# Altium footprint library 6-Connectors-6.PcbLib: 117 footprints (part 6 of 8)
Each footprint in its own frame and in the unit in brackets; x right, y up, seen from the top. Pads: shape width x height; smd on the part's side, far side on the other; paste and mask are expansions set on the pad; w line width, h text height; cw(c..) or ccw(c..) is an arc to the next point about the centre after c.
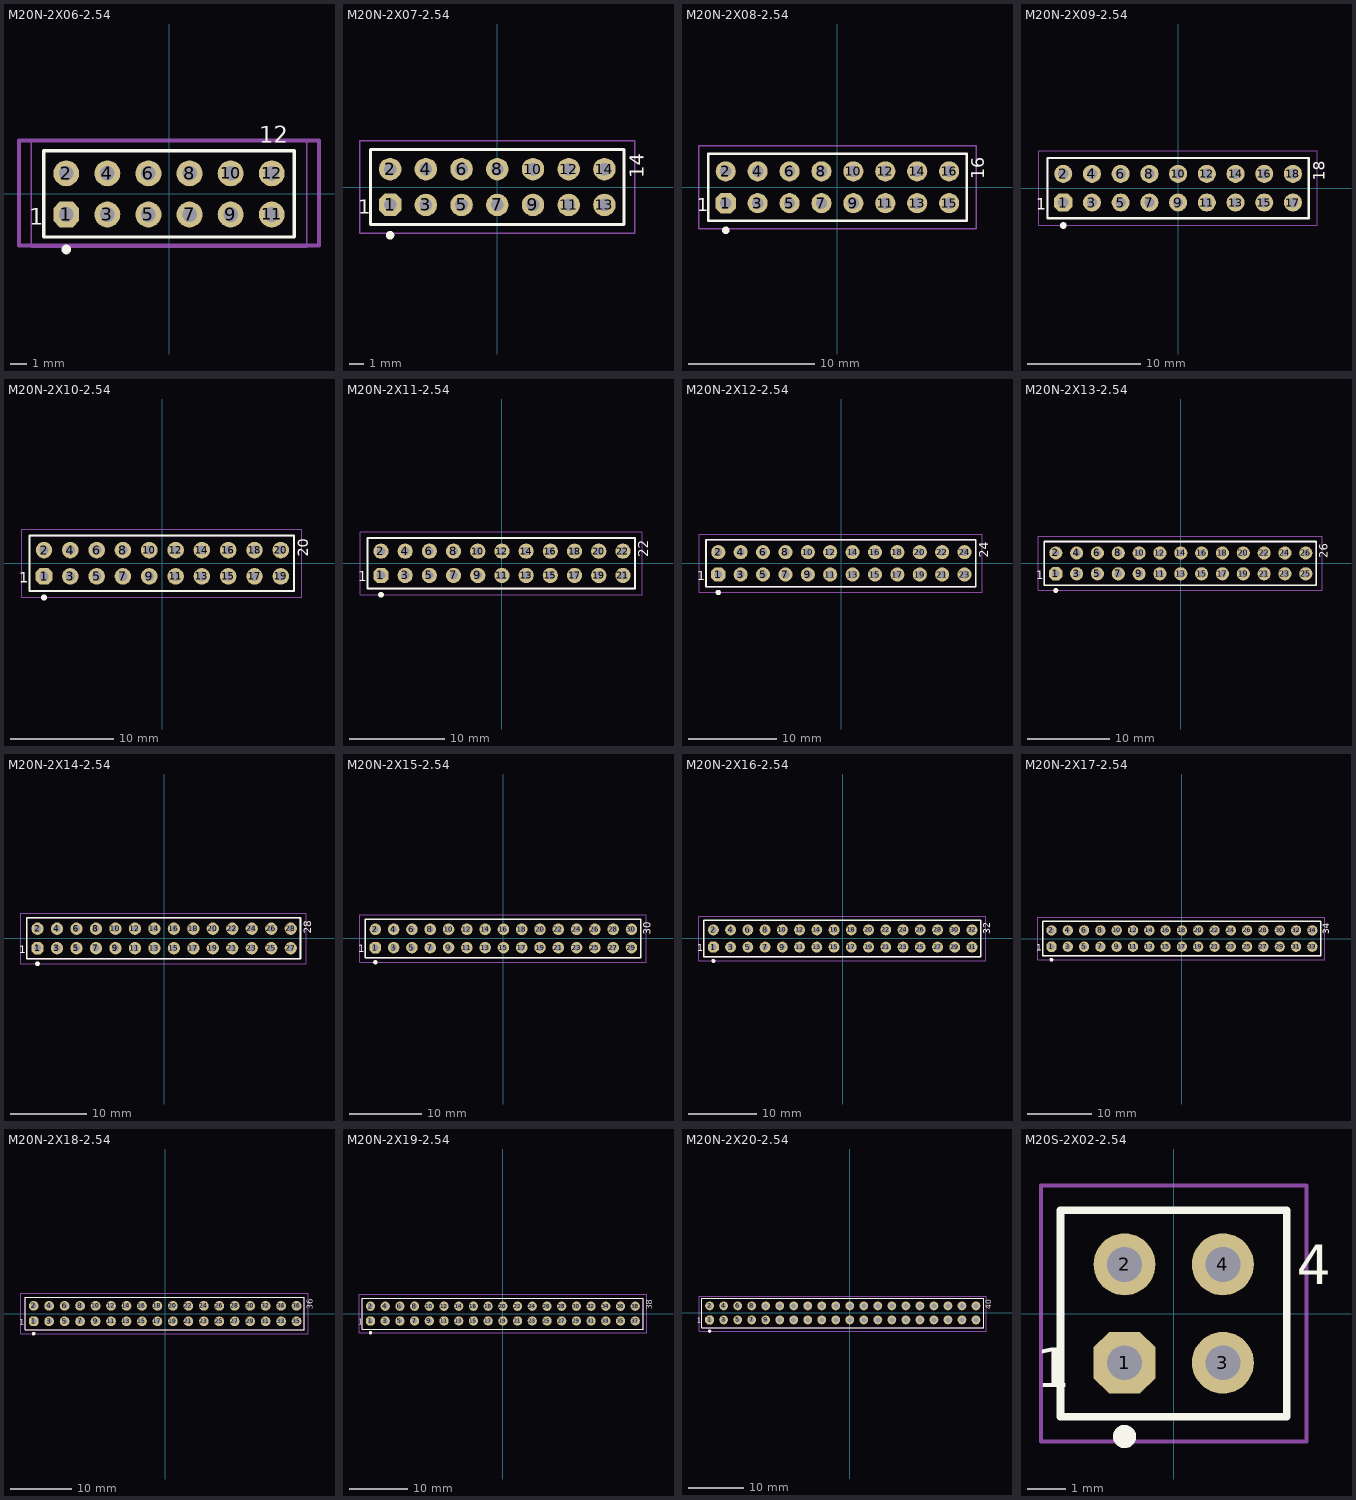
[diagram p5: the footprints below, top view; thin cyan lines are the x and y axes]

## M20N-2X06-2.54 [mm]
height 11
pads (12):
  oct 1.6x1.6 hole 0.9: 1(-6.35,-1.27)
  round 1.6 hole 0.9: 2(-6.35,1.27) 3(-3.81,-1.27) 4(-3.81,1.27) 5(-1.27,-1.27) 6(-1.27,1.27) 7(1.27,-1.27) 8(1.27,1.27) 9(3.81,-1.27) 10(3.81,1.27) 11(6.35,-1.27) 12(6.35,1.27)
Top Overlay:
  circle w0.3: c-6.35,-3.429 r0.15
  lines w0.2: -7.747,-2.667 7.747,-2.667 7.747,2.667 -7.747,2.667 -7.747,-2.667
  text "1" at -8.636,-1.905 h1.02
  text "12" at 5.588,3.175 h1.02
Mechanical 8:
  lines w0.1: -8.509,-3.302 8.509,-3.302 8.509,3.302 -8.509,3.302 -8.509,-3.302
Mechanical 14:
  lines w0.254: -9.271,-3.175 -9.271,3.302 9.271,3.302 9.271,-3.175 -9.271,-3.175
Mechanical 15:
  lines w0.1: -7.747,-2.667 -7.747,2.667 7.747,2.667 7.747,-2.667 -7.747,-2.667
3D body "arm254pad-n.stp": height 0.3, standoff -1.4, extent 5.55,-2.07 7.15,-0.47
3D body "arm254pad-n.stp": height 0.3, standoff -1.4, extent 5.55,0.47 7.15,2.07
3D body "arm254pad-n.stp": height 0.3, standoff -1.4, extent 3.01,0.47 4.61,2.07
3D body "arm254pad-n.stp": height 0.3, standoff -1.4, extent 3.01,-2.07 4.61,-0.47
3D body "arm254pad-n.stp": height 0.3, standoff -1.4, extent 0.47,-2.07 2.07,-0.47
3D body "arm254pad-n.stp": height 0.3, standoff -1.4, extent 0.47,0.47 2.07,2.07
3D body "arm254pad-n.stp": height 0.3, standoff -1.4, extent -2.07,0.47 -0.47,2.07
3D body "arm254pad-n.stp": height 0.3, standoff -1.4, extent -2.07,-2.07 -0.47,-0.47
3D body "arm254pad-n.stp": height 0.3, standoff -1.4, extent -4.61,-2.07 -3.01,-0.47
3D body "arm254pad-n.stp": height 0.3, standoff -1.4, extent -7.15,-2.07 -5.55,-0.47
3D body "arm254pad-n.stp": height 0.3, standoff -1.4, extent -4.61,0.47 -3.01,2.07
3D body "m20-9980642.stp": height 9.54, standoff -3, extent -7.62,-2.54 7.62,2.54
3D body "arm254pad-n.stp": height 0.3, standoff -1.4, extent -7.15,0.47 -5.55,2.07

## M20N-2X07-2.54 [mm]
height 11
pads (14):
  oct 1.6x1.6 hole 0.9: 1(-7.62,-1.27)
  round 1.6 hole 0.9: 2(-7.62,1.27) 3(-5.08,-1.27) 4(-5.08,1.27) 5(-2.54,-1.27) 6(-2.54,1.27) 7(0,-1.27) 8(0,1.27) 9(2.54,-1.27) 10(2.54,1.27) 11(5.08,-1.27) 12(5.08,1.27) 13(7.62,-1.27) 14(7.62,1.27)
Top Overlay:
  circle w0.3: c-7.62,-3.429 r0.15
  lines w0.2: -9.017,-2.667 -9.017,2.667 9.017,2.667 9.017,-2.667 -9.017,-2.667
  text "14" at 10.414,0.635 h1.02
  text "1" at -9.906,-1.905 h1.02
Mechanical 8:
  lines w0.1: -9.779,-3.302 -9.779,3.302 9.779,3.302 9.779,-3.302 -9.779,-3.302
Mechanical 15:
  lines w0.1: -9.017,-2.667 9.017,-2.667 9.017,2.667 -9.017,2.667 -9.017,-2.667
3D body "m20-9980742.stp": height 9.54, standoff -3, extent -8.89,-2.54 8.89,2.54

## M20N-2X08-2.54 [mm]
height 11
pads (16):
  oct 1.6x1.6 hole 0.9: 1(-8.89,-1.27)
  round 1.6 hole 0.9: 2(-8.89,1.27) 3(-6.35,-1.27) 4(-6.35,1.27) 5(-3.81,-1.27) 6(-3.81,1.27) 7(-1.27,-1.27) 8(-1.27,1.27) 9(1.27,-1.27) 10(1.27,1.27) 11(3.81,-1.27) 12(3.81,1.27) 13(6.35,-1.27) 14(6.35,1.27) 15(8.89,-1.27) 16(8.89,1.27)
Top Overlay:
  circle w0.3: c-8.89,-3.429 r0.15
  lines w0.2: -10.287,-2.667 -10.287,2.667 10.287,2.667 10.287,-2.667 -10.287,-2.667
  text "16" at 11.684,0.635 h1.02
  text "1" at -11.176,-1.905 h1.02
Mechanical 8:
  lines w0.1: -11.049,-3.302 -11.049,3.302 11.049,3.302 11.049,-3.302 -11.049,-3.302
Mechanical 15:
  lines w0.1: -10.287,-2.667 10.287,-2.667 10.287,2.667 -10.287,2.667 -10.287,-2.667
3D body "m20-9980842.stp": height 9.54, standoff -3, extent -10.16,-2.54 10.16,2.54

## M20N-2X09-2.54 [mm]
height 11
pads (18):
  oct 1.6x1.6 hole 0.9: 1(-10.16,-1.27)
  round 1.6 hole 0.9: 2(-10.16,1.27) 3(-7.62,-1.27) 4(-7.62,1.27) 5(-5.08,-1.27) 6(-5.08,1.27) 7(-2.54,-1.27) 8(-2.54,1.27) 9(0,-1.27) 10(0,1.27) 11(2.54,-1.27) 12(2.54,1.27) 13(5.08,-1.27) 14(5.08,1.27) 15(7.62,-1.27) 16(7.62,1.27) 17(10.16,-1.27) 18(10.16,1.27)
Top Overlay:
  circle w0.3: c-10.16,-3.302 r0.15
  lines w0.2: -11.557,-2.667 -11.557,2.667 11.557,2.667 11.557,-2.667 -11.557,-2.667
  text "18" at 12.954,0.635 h1.02
  text "1" at -12.573,-1.905 h1.02
Mechanical 8:
  lines w0.1: -12.319,-3.302 -12.319,3.302 12.319,3.302 12.319,-3.302 -12.319,-3.302
Mechanical 15:
  lines w0.1: -11.557,-2.667 11.557,-2.667 11.557,2.667 -11.557,2.667 -11.557,-2.667
3D body "m20-9980942.stp": height 9.54, standoff -3, extent -11.43,-2.54 11.43,2.54

## M20N-2X10-2.54 [mm]
height 11
pads (20):
  oct 1.6x1.6 hole 0.9: 1(-11.43,-1.27)
  round 1.6 hole 0.9: 2(-11.43,1.27) 3(-8.89,-1.27) 4(-8.89,1.27) 5(-6.35,-1.27) 6(-6.35,1.27) 7(-3.81,-1.27) 8(-3.81,1.27) 9(-1.27,-1.27) 10(-1.27,1.27) 11(1.27,-1.27) 12(1.27,1.27) 13(3.81,-1.27) 14(3.81,1.27) 15(6.35,-1.27) 16(6.35,1.27) 17(8.89,-1.27) 18(8.89,1.27) 19(11.43,-1.27) 20(11.43,1.27)
Top Overlay:
  circle w0.3: c-11.43,-3.302 r0.15
  lines w0.2: -12.827,-2.667 12.7,-2.667 12.7,2.667 -12.827,2.667 -12.827,-2.667
  text "1" at -13.843,-1.905 h1.02
  text "20" at 14.097,0.635 h1.02
Mechanical 8:
  lines w0.1: -13.589,-3.302 13.462,-3.302 13.462,3.302 -13.589,3.302 -13.589,-3.302
Mechanical 15:
  lines w0.1: -12.827,-2.667 -12.827,2.667 12.7,2.667 12.7,-2.667 -12.827,-2.667
3D body "m20-9981042.stp": height 9.54, standoff -3, extent -12.7,-2.54 12.7,2.54

## M20N-2X11-2.54 [mm]
height 11
pads (22):
  oct 1.6x1.6 hole 0.9: 1(-12.7,-1.27)
  round 1.6 hole 0.9: 2(-12.7,1.27) 3(-10.16,-1.27) 4(-10.16,1.27) 5(-7.62,-1.27) 6(-7.62,1.27) 7(-5.08,-1.27) 8(-5.08,1.27) 9(-2.54,-1.27) 10(-2.54,1.27) 11(0,-1.27) 12(0,1.27) 13(2.54,-1.27) 14(2.54,1.27) 15(5.08,-1.27) 16(5.08,1.27) 17(7.62,-1.27) 18(7.62,1.27) 19(10.16,-1.27) 20(10.16,1.27) 21(12.7,-1.27) 22(12.7,1.27)
Top Overlay:
  circle w0.3: c-12.7,-3.302 r0.15
  lines w0.2: -14.097,-2.667 -14.097,2.667 13.97,2.667 13.97,-2.667 -14.097,-2.667
  text "22" at 15.367,0.635 h1.02
  text "1" at -15.113,-1.905 h1.02
Mechanical 8:
  lines w0.1: -14.859,-3.302 -14.859,3.302 14.732,3.302 14.732,-3.302 -14.859,-3.302
Mechanical 15:
  lines w0.1: -14.097,-2.667 13.97,-2.667 13.97,2.667 -14.097,2.667 -14.097,-2.667
3D body "m20-9981142.stp": height 9.54, standoff -3, extent -13.97,-2.54 13.97,2.54

## M20N-2X12-2.54 [mm]
height 11
pads (24):
  oct 1.6x1.6 hole 0.9: 1(-13.97,-1.27)
  round 1.6 hole 0.9: 2(-13.97,1.27) 3(-11.43,-1.27) 4(-11.43,1.27) 5(-8.89,-1.27) 6(-8.89,1.27) 7(-6.35,-1.27) 8(-6.35,1.27) 9(-3.81,-1.27) 10(-3.81,1.27) 11(-1.27,-1.27) 12(-1.27,1.27) 13(1.27,-1.27) 14(1.27,1.27) 15(3.81,-1.27) 16(3.81,1.27) 17(6.35,-1.27) 18(6.35,1.27) 19(8.89,-1.27) 20(8.89,1.27) 21(11.43,-1.27) 22(11.43,1.27) 23(13.97,-1.27) 24(13.97,1.27)
Top Overlay:
  circle w0.3: c-13.97,-3.302 r0.15
  lines w0.2: -15.367,-2.667 15.24,-2.667 15.24,2.667 -15.367,2.667 -15.367,-2.667
  text "1" at -16.383,-1.905 h1.02
  text "24" at 16.637,0.635 h1.02
Mechanical 8:
  lines w0.1: -16.129,-3.302 16.002,-3.302 16.002,3.302 -16.129,3.302 -16.129,-3.302
Mechanical 15:
  lines w0.1: -15.367,-2.667 -15.367,2.667 15.24,2.667 15.24,-2.667 -15.367,-2.667
3D body "m20-9981242.stp": height 9.54, standoff -3, extent -15.24,-2.54 15.24,2.54

## M20N-2X13-2.54 [mm]
height 11
pads (26):
  oct 1.6x1.6 hole 0.9: 1(-15.24,-1.27)
  round 1.6 hole 0.9: 2(-15.24,1.27) 3(-12.7,-1.27) 4(-12.7,1.27) 5(-10.16,-1.27) 6(-10.16,1.27) 7(-7.62,-1.27) 8(-7.62,1.27) 9(-5.08,-1.27) 10(-5.08,1.27) 11(-2.54,-1.27) 12(-2.54,1.27) 13(0,-1.27) 14(0,1.27) 15(2.54,-1.27) 16(2.54,1.27) 17(5.08,-1.27) 18(5.08,1.27) 19(7.62,-1.27) 20(7.62,1.27) 21(10.16,-1.27) 22(10.16,1.27) 23(12.7,-1.27) 24(12.7,1.27) 25(15.24,-1.27) 26(15.24,1.27)
Top Overlay:
  circle w0.3: c-15.24,-3.302 r0.15
  lines w0.2: -16.637,-2.667 16.51,-2.667 16.51,2.667 -16.637,2.667 -16.637,-2.667
  text "1" at -17.653,-1.905 h1.02
  text "26" at 17.907,0.635 h1.02
Mechanical 8:
  lines w0.1: -17.399,-3.302 17.272,-3.302 17.272,3.302 -17.399,3.302 -17.399,-3.302
Mechanical 15:
  lines w0.1: -16.637,-2.667 -16.637,2.667 16.51,2.667 16.51,-2.667 -16.637,-2.667
3D body "m20-9981342.stp": height 9.54, standoff -3, extent -16.51,-2.54 16.51,2.54

## M20N-2X14-2.54 [mm]
height 11
pads (28):
  oct 1.6x1.6 hole 0.9: 1(-16.51,-1.27)
  round 1.6 hole 0.9: 2(-16.51,1.27) 3(-13.97,-1.27) 4(-13.97,1.27) 5(-11.43,-1.27) 6(-11.43,1.27) 7(-8.89,-1.27) 8(-8.89,1.27) 9(-6.35,-1.27) 10(-6.35,1.27) 11(-3.81,-1.27) 12(-3.81,1.27) 13(-1.27,-1.27) 14(-1.27,1.27) 15(1.27,-1.27) 16(1.27,1.27) 17(3.81,-1.27) 18(3.81,1.27) 19(6.35,-1.27) 20(6.35,1.27) 21(8.89,-1.27) 22(8.89,1.27) 23(11.43,-1.27) 24(11.43,1.27) 25(13.97,-1.27) 26(13.97,1.27) 27(16.51,-1.27) 28(16.51,1.27)
Top Overlay:
  circle w0.3: c-16.51,-3.302 r0.15
  lines w0.2: -17.907,-2.667 17.78,-2.667 17.78,2.667 -17.907,2.667 -17.907,-2.667
  text "1" at -18.923,-1.905 h1.02
  text "28" at 19.177,0.635 h1.02
Mechanical 8:
  lines w0.1: -18.669,-3.302 18.542,-3.302 18.542,3.302 -18.669,3.302 -18.669,-3.302
Mechanical 15:
  lines w0.1: -17.907,-2.667 -17.907,2.667 17.78,2.667 17.78,-2.667 -17.907,-2.667
3D body "m20-9981442.stp": height 9.54, standoff -3, extent -17.78,-2.54 17.78,2.54

## M20N-2X15-2.54 [mm]
height 11
pads (30):
  oct 1.6x1.6 hole 0.9: 1(-17.78,-1.27)
  round 1.6 hole 0.9: 2(-17.78,1.27) 3(-15.24,-1.27) 4(-15.24,1.27) 5(-12.7,-1.27) 6(-12.7,1.27) 7(-10.16,-1.27) 8(-10.16,1.27) 9(-7.62,-1.27) 10(-7.62,1.27) 11(-5.08,-1.27) 12(-5.08,1.27) 13(-2.54,-1.27) 14(-2.54,1.27) 15(0,-1.27) 16(0,1.27) 17(2.54,-1.27) 18(2.54,1.27) 19(5.08,-1.27) 20(5.08,1.27) 21(7.62,-1.27) 22(7.62,1.27) 23(10.16,-1.27) 24(10.16,1.27) 25(12.7,-1.27) 26(12.7,1.27) 27(15.24,-1.27) 28(15.24,1.27) 29(17.78,-1.27) 30(17.78,1.27)
Top Overlay:
  circle w0.3: c-17.78,-3.302 r0.15
  lines w0.2: -19.177,-2.667 19.05,-2.667 19.05,2.667 -19.177,2.667 -19.177,-2.667
  text "1" at -20.193,-1.905 h1.02
  text "30" at 20.447,0.508 h1.02
Mechanical 8:
  lines w0.1: -19.939,-3.302 19.812,-3.302 19.812,3.302 -19.939,3.302 -19.939,-3.302
Mechanical 15:
  lines w0.1: -19.177,-2.667 -19.177,2.667 19.05,2.667 19.05,-2.667 -19.177,-2.667
3D body "m20-9981542.stp": height 9.54, standoff -3, extent -19.05,-2.54 19.05,2.54

## M20N-2X16-2.54 [mm]
height 11
pads (32):
  oct 1.6x1.6 hole 0.9: 1(-19.05,-1.27)
  round 1.6 hole 0.9: 2(-19.05,1.27) 3(-16.51,-1.27) 4(-16.51,1.27) 5(-13.97,-1.27) 6(-13.97,1.27) 7(-11.43,-1.27) 8(-11.43,1.27) 9(-8.89,-1.27) 10(-8.89,1.27) 11(-6.35,-1.27) 12(-6.35,1.27) 13(-3.81,-1.27) 14(-3.81,1.27) 15(-1.27,-1.27) 16(-1.27,1.27) 17(1.27,-1.27) 18(1.27,1.27) 19(3.81,-1.27) 20(3.81,1.27) 21(6.35,-1.27) 22(6.35,1.27) 23(8.89,-1.27) 24(8.89,1.27) 25(11.43,-1.27) 26(11.43,1.27) 27(13.97,-1.27) 28(13.97,1.27) 29(16.51,-1.27) 30(16.51,1.27) 31(19.05,-1.27) 32(19.05,1.27)
Top Overlay:
  circle w0.3: c-19.05,-3.302 r0.15
  lines w0.2: -20.447,-2.667 -20.447,2.667 20.32,2.667 20.32,-2.667 -20.447,-2.667
  text "32" at 21.717,0.635 h1.02
  text "1" at -21.463,-1.905 h1.02
Mechanical 8:
  lines w0.1: -21.209,-3.302 -21.209,3.302 21.082,3.302 21.082,-3.302 -21.209,-3.302
Mechanical 15:
  lines w0.1: -20.447,-2.667 20.32,-2.667 20.32,2.667 -20.447,2.667 -20.447,-2.667
3D body "m20-9981642.stp": height 9.54, standoff -3, extent -20.32,-2.54 20.32,2.54

## M20N-2X17-2.54 [mm]
height 11
pads (34):
  oct 1.6x1.6 hole 0.9: 1(-20.32,-1.27)
  round 1.6 hole 0.9: 2(-20.32,1.27) 3(-17.78,-1.27) 4(-17.78,1.27) 5(-15.24,-1.27) 6(-15.24,1.27) 7(-12.7,-1.27) 8(-12.7,1.27) 9(-10.16,-1.27) 10(-10.16,1.27) 11(-7.62,-1.27) 12(-7.62,1.27) 13(-5.08,-1.27) 14(-5.08,1.27) 15(-2.54,-1.27) 16(-2.54,1.27) 17(0,-1.27) 18(0,1.27) 19(2.54,-1.27) 20(2.54,1.27) 21(5.08,-1.27) 22(5.08,1.27) 23(7.62,-1.27) 24(7.62,1.27) 25(10.16,-1.27) 26(10.16,1.27) 27(12.7,-1.27) 28(12.7,1.27) 29(15.24,-1.27) 30(15.24,1.27) 31(17.78,-1.27) 32(17.78,1.27) 33(20.32,-1.27) 34(20.32,1.27)
Top Overlay:
  circle w0.3: c-20.32,-3.302 r0.15
  lines w0.2: -21.717,-2.667 21.59,-2.667 21.59,2.667 -21.717,2.667 -21.717,-2.667
  text "1" at -22.733,-1.905 h1.02
  text "34" at 22.987,0.635 h1.02
Mechanical 8:
  lines w0.1: -22.479,-3.302 22.225,-3.302 22.225,3.302 -22.479,3.302 -22.479,-3.302
Mechanical 15:
  lines w0.1: -21.717,-2.667 -21.717,2.667 21.59,2.667 21.59,-2.667 -21.717,-2.667
3D body "m20-9981742.stp": height 9.54, standoff -3, extent -21.59,-2.54 21.59,2.54

## M20N-2X18-2.54 [mm]
height 11
pads (36):
  oct 1.6x1.6 hole 0.9: 1(-21.59,-1.27)
  round 1.6 hole 0.9: 2(-21.59,1.27) 3(-19.05,-1.27) 4(-19.05,1.27) 5(-16.51,-1.27) 6(-16.51,1.27) 7(-13.97,-1.27) 8(-13.97,1.27) 9(-11.43,-1.27) 10(-11.43,1.27) 11(-8.89,-1.27) 12(-8.89,1.27) 13(-6.35,-1.27) 14(-6.35,1.27) 15(-3.81,-1.27) 16(-3.81,1.27) 17(-1.27,-1.27) 18(-1.27,1.27) 19(1.27,-1.27) 20(1.27,1.27) 21(3.81,-1.27) 22(3.81,1.27) 23(6.35,-1.27) 24(6.35,1.27) 25(8.89,-1.27) 26(8.89,1.27) 27(11.43,-1.27) 28(11.43,1.27) 29(13.97,-1.27) 30(13.97,1.27) 31(16.51,-1.27) 32(16.51,1.27) 33(19.05,-1.27) 34(19.05,1.27) 35(21.59,-1.27) 36(21.59,1.27)
Top Overlay:
  circle w0.3: c-21.59,-3.302 r0.15
  lines w0.2: -22.987,-2.667 -22.987,2.667 22.86,2.667 22.86,-2.667 -22.987,-2.667
  text "36" at 24.257,0.635 h1.02
  text "1" at -24.003,-1.905 h1.02
Mechanical 8:
  lines w0.1: -23.749,-3.302 -23.749,3.302 23.495,3.302 23.495,-3.302 -23.749,-3.302
Mechanical 15:
  lines w0.1: -22.987,-2.667 22.86,-2.667 22.86,2.667 -22.987,2.667 -22.987,-2.667
3D body "m20-9981842.stp": height 9.54, standoff -3, extent -22.86,-2.54 22.86,2.54

## M20N-2X19-2.54 [mm]
height 11
pads (38):
  oct 1.6x1.6 hole 0.9: 1(-22.86,-1.27)
  round 1.6 hole 0.9: 2(-22.86,1.27) 3(-20.32,-1.27) 4(-20.32,1.27) 5(-17.78,-1.27) 6(-17.78,1.27) 7(-15.24,-1.27) 8(-15.24,1.27) 9(-12.7,-1.27) 10(-12.7,1.27) 11(-10.16,-1.27) 12(-10.16,1.27) 13(-7.62,-1.27) 14(-7.62,1.27) 15(-5.08,-1.27) 16(-5.08,1.27) 17(-2.54,-1.27) 18(-2.54,1.27) 19(0,-1.27) 20(0,1.27) 21(2.54,-1.27) 22(2.54,1.27) 23(5.08,-1.27) 24(5.08,1.27) 25(7.62,-1.27) 26(7.62,1.27) 27(10.16,-1.27) 28(10.16,1.27) 29(12.7,-1.27) 30(12.7,1.27) 31(15.24,-1.27) 32(15.24,1.27) 33(17.78,-1.27) 34(17.78,1.27) 35(20.32,-1.27) 36(20.32,1.27) 37(22.86,-1.27) 38(22.86,1.27)
Top Overlay:
  circle w0.3: c-22.86,-3.302 r0.15
  lines w0.2: -24.257,-2.667 24.257,-2.667 24.257,2.667 -24.257,2.667 -24.257,-2.667
  text "1" at -25.019,-1.905 h1.02
  text "38" at 25.781,0.635 h1.02
Mechanical 8:
  lines w0.1: -24.765,-3.302 24.892,-3.302 24.892,3.302 -24.765,3.302 -24.765,-3.302
Mechanical 15:
  lines w0.1: -24.257,-2.667 -24.257,2.667 24.257,2.667 24.257,-2.667 -24.257,-2.667
3D body "m20-9981942.stp": height 9.54, standoff -3, extent -24.13,-2.54 24.13,2.54

## M20N-2X20-2.54 [mm]
height 11
pads (40):
  oct 1.6x1.6 hole 0.9: 1(-25.4,-1.27)
  round 1.6 hole 0.9: 2(-25.4,1.27) 3(-22.86,-1.27) 4(-22.86,1.27) 5(-20.32,-1.27) 6(-20.32,1.27) 7(-17.78,-1.27) 8(-17.78,1.27) 9(-15.24,-1.27) 10(-15.24,1.27) 11(-12.7,-1.27) 12(-12.7,1.27) 13(-10.16,-1.27) 14(-10.16,1.27) 15(-7.62,-1.27) 16(-7.62,1.27) 17(-5.08,-1.27) 18(-5.08,1.27) 19(-2.54,-1.27) 20(-2.54,1.27) 21(0,-1.27) 22(0,1.27) 23(2.54,-1.27) 24(2.54,1.27) 25(5.08,-1.27) 26(5.08,1.27) 27(7.62,-1.27) 28(7.62,1.27) 29(10.16,-1.27) 30(10.16,1.27) 31(12.7,-1.27) 32(12.7,1.27) 33(15.24,-1.27) 34(15.24,1.27) 35(17.78,-1.27) 36(17.78,1.27) 37(20.32,-1.27) 38(20.32,1.27) 39(22.86,-1.27) 40(22.86,1.27)
Top Overlay:
  circle w0.3: c-25.4,-3.302 r0.15
  lines w0.2: -26.797,-2.667 24.257,-2.667 24.257,2.667 -26.797,2.667 -26.797,-2.667
  text "1" at -27.686,-1.905 h1.02
  text "40" at 25.654,0.635 h1.02
Mechanical 8:
  lines w0.1: -27.305,-3.302 24.765,-3.302 24.765,3.05 -27.305,3.05 -27.305,-3.302
Mechanical 15:
  lines w0.1: -26.797,-2.667 -26.797,2.667 24.257,2.667 24.257,-2.667 -26.797,-2.667
3D body "m20-9982042.stp": height 9.54, standoff -3, extent -26.67,-2.54 24.13,2.54

## M20S-2X02-2.54 [mm]
height 11
pads (4):
  oct 1.6x1.6 hole 0.9: 1(-1.27,-1.27)
  round 1.6 hole 0.9: 2(-1.27,1.27) 3(1.27,-1.27) 4(1.27,1.27)
Top Overlay:
  circle w0.3: c-1.27,-3.175 r0.15
  lines w0.2: -2.921,-2.667 2.921,-2.667 2.921,2.667 -2.921,2.667 -2.921,-2.667
  text "1" at -3.556,-1.905 h1.02
  text "4" at 3.175,0.762 h1.02
Mechanical 8:
  lines w0.1: -3.429,-3.302 3.429,-3.302 3.429,3.302 -3.429,3.302 -3.429,-3.302
Mechanical 15:
  lines w0.1: -2.921,-2.667 -2.921,2.667 2.921,2.667 2.921,-2.667 -2.921,-2.667
3D body "m20s-2x02-2_54.stp": height 8.4, standoff -3.1, extent -2.86,-2.54 2.86,2.54